# Altium footprint library LukaLIBRARY.PcbLib: 772 footprints (part 38 of 49)
Each footprint in its own frame and in the unit in brackets; x right, y up, seen from the top. Pads: shape width x height; smd on the part's side, far side on the other; paste and mask are expansions set on the pad; w line width, h text height; cw(c..) or ccw(c..) is an arc to the next point about the centre after c.
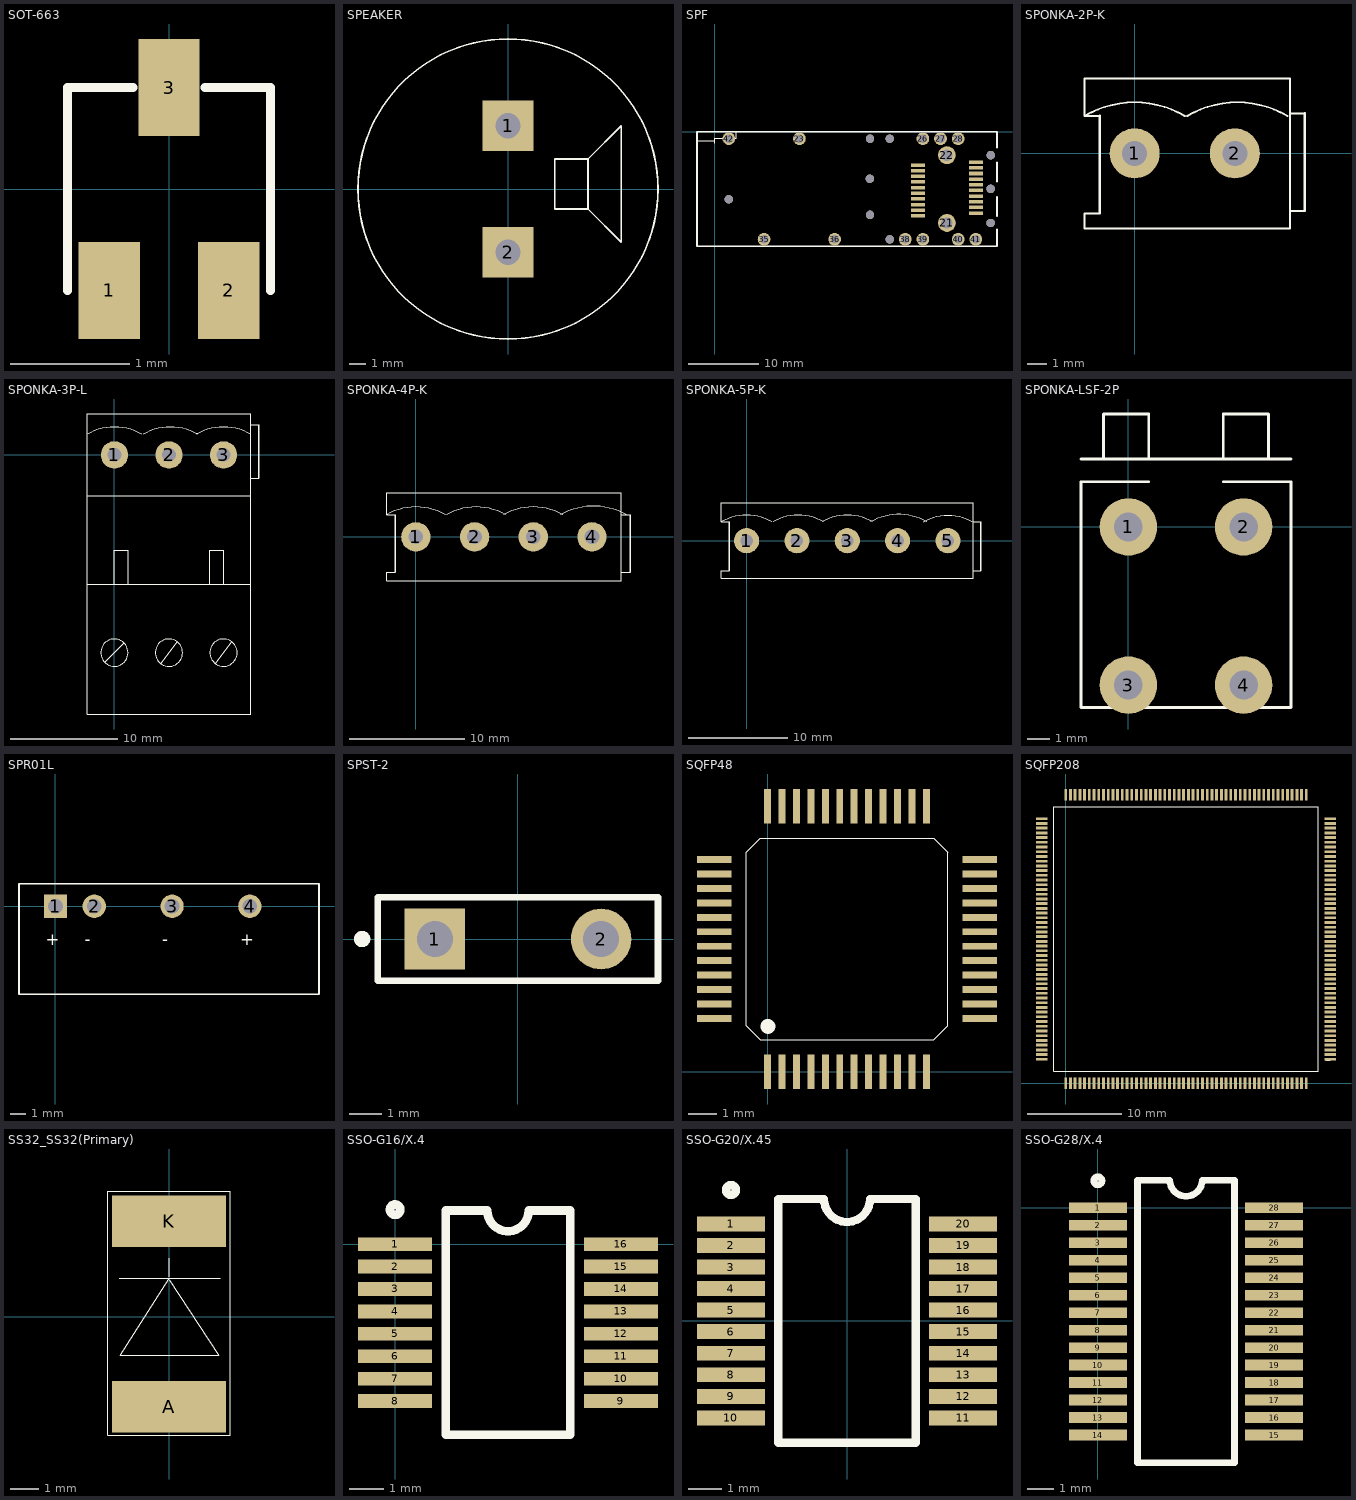
[diagram p37: the footprints below, top view; thin cyan lines are the x and y axes]

## SOT-663 [mm]
pads (3):
  rect 0.513x0.813 smd: 1(-0.5,-0.85) 2(0.5,-0.85) 3(0,0.85)
Top Overlay:
  lines w0.076: -0.85,-0.85 -0.85,0.85 -0.3,0.85 ; 0.3,0.85 0.85,0.85 0.85,-0.85

## SPEAKER [mil]
pads (2):
  rect 120x120 hole 60 mask-1000: 1(0,149.61) 2(0,-149.61)
Top Overlay:
  circle w3.94: c0,0 r354.33
  lines w3.94: 188.98,-47.24 110.24,-47.24 110.24,70.87 188.98,70.87 ; 188.98,-47.24 188.98,70.87 ; 188.98,-47.24 267.72,-125.98 267.72,149.61 188.98,70.87
Top Solder:
  region: -60,-209.61 60,-209.61 60,-89.61 -60,-89.61
  region: -60,89.61 60,89.61 60,209.61 -60,209.61
Bottom Solder:
  region: -60,-209.61 60,-209.61 60,-89.61 -60,-89.61
  region: -60,89.61 60,89.61 60,209.61 -60,209.61

## SPF [mm]
pads (42):
  rect 2x0.5 smd mask-25.4: 1(28.78,-4.72) 2(28.78,-5.52) 3(28.78,-6.32) 4(28.78,-7.12) 5(28.78,-7.92) 6(28.78,-8.72) 7(28.78,-9.52) 8(28.78,-10.32) 9(28.78,-11.12) 10(28.78,-11.92) 11(36.98,-11.52) 12(36.98,-10.72) 13(36.98,-9.92) 14(36.98,-9.12) 15(36.98,-8.32) 16(36.98,-7.52) 17(36.98,-6.72) 18(36.98,-5.92) 19(36.98,-5.12) 20(36.98,-4.32)
  round 2.524 hole 1.6: 21(32.88,-12.92) 22(32.88,-3.32)
  round 1.8 hole 1.2 mask-25.4: 23(11.99,-0.99) 26(29.48,-0.99) 27(31.98,-0.99) 28(34.48,-0.99) 35(6.98,-15.24) 36(16.98,-15.24) 38(26.98,-15.24) 39(29.48,-15.24) 40(34.48,-15.24) 41(36.98,-15.24) 42(1.99,-0.98)
  round 1.2 hole 1.2 mask-25.4: 24(21.99,-0.99) 25(24.78,-0.99) 29(39.09,-3.32) 30(39.08,-8.1) 31(39.08,-12.93) 32(21.98,-6.66) 33(1.99,-9.56) 34(21.99,-11.79) 37(24.78,-15.25)
Top Layer:
  lines w0.01: 39.08,-12.93 39.08,-12.9
Top Overlay:
  lines w0.01: -2.49,-1.29 0.01,-1.29 ; 0.01,-1.61 0.01,-0.89 3.01,-0.89 3.01,-0.01
  lines w0.254: 39.97,-11.98 39.97,-9.22 39.97,-9.2 ; 39.97,-2.24 39.97,0.01 -2.52,0.01 -2.52,-16.24 39.98,-16.24 39.98,-13.85 ; 39.98,-7.04 39.98,-4.35
Top Solder:
  drawing of 40 lines, arcs and shapes, not listed
Bottom Solder:
  drawing of 20 lines, arcs and shapes, not listed

## SPONKA-2P-K [mm]
pads (2):
  round 2.54 hole 1.27 mask-25.4: 1(0,0) 2(5.08,0)
Top Overlay:
  lines w0.1: -2.543,1.903 cw(c0,-2.413) 2.543,1.903 ; -1.778,-3.048 -2.54,-3.048 -2.54,-3.81 7.874,-3.81 7.874,3.81 -2.54,3.81 -2.54,1.905 -1.778,1.905 ; 2.664,1.903 cw(c5.207,-2.413) 7.75,1.903 ; 7.874,-2.921 8.636,-2.921 ; 7.874,2.032 8.636,2.032
  lines w0.127: -1.778,-3.048 -1.778,1.905 ; 8.636,-2.921 8.636,2.032
Top Solder:
  region: 5.08,1.281 4.748,1.237 4.44,1.109 4.174,0.906 3.971,0.64 3.843,0.332 3.799,0 3.843,-0.332 3.971,-0.64 4.174,-0.906 4.44,-1.109 4.748,-1.237 5.08,-1.281 5.412,-1.237 5.72,-1.109 5.986,-0.906 6.189,-0.64 6.317,-0.332 6.361,0 6.317,0.332 6.189,0.64 5.986,0.906 5.72,1.109 5.412,1.237
  region: 0,1.281 -0.332,1.237 -0.64,1.109 -0.906,0.906 -1.109,0.64 -1.237,0.332 -1.281,0 -1.237,-0.332 -1.109,-0.64 -0.906,-0.906 -0.64,-1.109 -0.332,-1.237 0,-1.281 0.332,-1.237 0.64,-1.109 0.906,-0.906 1.109,-0.64 1.237,-0.332 1.281,0 1.237,0.332 1.109,0.64 0.906,0.906 0.64,1.109 0.332,1.237
Bottom Solder:
  region: 5.08,1.281 4.748,1.237 4.44,1.109 4.174,0.906 3.971,0.64 3.843,0.332 3.799,0 3.843,-0.332 3.971,-0.64 4.174,-0.906 4.44,-1.109 4.748,-1.237 5.08,-1.281 5.412,-1.237 5.72,-1.109 5.986,-0.906 6.189,-0.64 6.317,-0.332 6.361,0 6.317,0.332 6.189,0.64 5.986,0.906 5.72,1.109 5.412,1.237
  region: 0,1.281 -0.332,1.237 -0.64,1.109 -0.906,0.906 -1.109,0.64 -1.237,0.332 -1.281,0 -1.237,-0.332 -1.109,-0.64 -0.906,-0.906 -0.64,-1.109 -0.332,-1.237 0,-1.281 0.332,-1.237 0.64,-1.109 0.906,-0.906 1.109,-0.64 1.237,-0.332 1.281,0 1.237,0.332 1.109,0.64 0.906,0.906 0.64,1.109 0.332,1.237

## SPONKA-3P-L [mm]
pads (3):
  round 2.54 hole 1.27 mask-25.4: 1(0,0) 2(5.08,0) 3(10.16,0)
Top Overlay:
  circle w0.1: c5.08,-18.415 r1.27
  circle w0.1: c10.16,-18.415 r1.27
  circle w0.1: c0,-18.415 r1.27
  lines w0.1: -2.543,1.903 cw(c0,-2.413) 2.543,1.903 ; -2.54,-12.065 12.7,-12.065 ; -2.54,-3.81 12.7,-3.81 ; -0.889,-19.304 0.889,-17.526 ; 0,-12.065 0,-8.89 1.27,-8.89 1.27,-12.065 ; 2.664,1.903 cw(c5.207,-2.413) 7.75,1.903 ; 4.318,-19.431 5.842,-17.399 ; 7.617,1.903 cw(c10.16,-2.413) 12.703,1.903 ; 8.89,-12.065 8.89,-8.89 10.16,-8.89 10.16,-12.065 ; 9.398,-19.431 10.922,-17.399 ; 12.7,-2.159 13.462,-2.159 ; 12.7,2.794 13.462,2.794 ; -2.54,-24.13 12.7,-24.13 12.7,3.81 -2.54,3.81 -2.54,-24.13
  lines w0.127: 13.462,-2.159 13.462,2.794
Top Solder:
  region: 5.08,1.281 4.748,1.237 4.44,1.109 4.174,0.906 3.971,0.64 3.843,0.332 3.799,0 3.843,-0.332 3.971,-0.64 4.174,-0.906 4.44,-1.109 4.748,-1.237 5.08,-1.281 5.412,-1.237 5.72,-1.109 5.986,-0.906 6.189,-0.64 6.317,-0.332 6.361,0 6.317,0.332 6.189,0.64 5.986,0.906 5.72,1.109 5.412,1.237
  region: 10.16,1.281 9.828,1.237 9.52,1.109 9.254,0.906 9.051,0.64 8.923,0.332 8.879,0 8.923,-0.332 9.051,-0.64 9.254,-0.906 9.52,-1.109 9.828,-1.237 10.16,-1.281 10.492,-1.237 10.8,-1.109 11.066,-0.906 11.269,-0.64 11.397,-0.332 11.441,0 11.397,0.332 11.269,0.64 11.066,0.906 10.8,1.109 10.492,1.237
  region: 0,1.281 -0.332,1.237 -0.64,1.109 -0.906,0.906 -1.109,0.64 -1.237,0.332 -1.281,0 -1.237,-0.332 -1.109,-0.64 -0.906,-0.906 -0.64,-1.109 -0.332,-1.237 0,-1.281 0.332,-1.237 0.64,-1.109 0.906,-0.906 1.109,-0.64 1.237,-0.332 1.281,0 1.237,0.332 1.109,0.64 0.906,0.906 0.64,1.109 0.332,1.237
Bottom Solder:
  region: 5.08,1.281 4.748,1.237 4.44,1.109 4.174,0.906 3.971,0.64 3.843,0.332 3.799,0 3.843,-0.332 3.971,-0.64 4.174,-0.906 4.44,-1.109 4.748,-1.237 5.08,-1.281 5.412,-1.237 5.72,-1.109 5.986,-0.906 6.189,-0.64 6.317,-0.332 6.361,0 6.317,0.332 6.189,0.64 5.986,0.906 5.72,1.109 5.412,1.237
  region: 10.16,1.281 9.828,1.237 9.52,1.109 9.254,0.906 9.051,0.64 8.923,0.332 8.879,0 8.923,-0.332 9.051,-0.64 9.254,-0.906 9.52,-1.109 9.828,-1.237 10.16,-1.281 10.492,-1.237 10.8,-1.109 11.066,-0.906 11.269,-0.64 11.397,-0.332 11.441,0 11.397,0.332 11.269,0.64 11.066,0.906 10.8,1.109 10.492,1.237
  region: 0,1.281 -0.332,1.237 -0.64,1.109 -0.906,0.906 -1.109,0.64 -1.237,0.332 -1.281,0 -1.237,-0.332 -1.109,-0.64 -0.906,-0.906 -0.64,-1.109 -0.332,-1.237 0,-1.281 0.332,-1.237 0.64,-1.109 0.906,-0.906 1.109,-0.64 1.237,-0.332 1.281,0 1.237,0.332 1.109,0.64 0.906,0.906 0.64,1.109 0.332,1.237

## SPONKA-4P-K [mm]
pads (4):
  round 2.54 hole 1.27 mask-25.4: 1(0,0) 2(5.08,0) 3(10.16,0) 4(15.24,0)
Top Overlay:
  lines w0.1: -2.543,1.903 cw(c0,-2.413) 2.543,1.903 ; -1.778,-3.048 -2.54,-3.048 -2.54,-3.81 17.78,-3.81 17.78,3.81 -2.54,3.81 -2.54,1.905 -1.778,1.905 ; 2.664,1.903 cw(c5.207,-2.413) 7.75,1.903 ; 7.617,1.903 cw(c10.16,-2.413) 12.703,1.903 ; 12.531,1.894 cw(c15.367,-2.921) 18.203,1.894 ; 17.78,-3.048 18.542,-3.048 ; 17.78,1.905 18.542,1.905
  lines w0.127: -1.778,-3.048 -1.778,1.905 ; 18.542,-3.048 18.542,1.905
Top Solder:
  region: 0,1.281 -0.332,1.237 -0.64,1.109 -0.906,0.906 -1.109,0.64 -1.237,0.332 -1.281,0 -1.237,-0.332 -1.109,-0.64 -0.906,-0.906 -0.64,-1.109 -0.332,-1.237 0,-1.281 0.332,-1.237 0.64,-1.109 0.906,-0.906 1.109,-0.64 1.237,-0.332 1.281,0 1.237,0.332 1.109,0.64 0.906,0.906 0.64,1.109 0.332,1.237
  region: 5.08,1.281 4.748,1.237 4.44,1.109 4.174,0.906 3.971,0.64 3.843,0.332 3.799,0 3.843,-0.332 3.971,-0.64 4.174,-0.906 4.44,-1.109 4.748,-1.237 5.08,-1.281 5.412,-1.237 5.72,-1.109 5.986,-0.906 6.189,-0.64 6.317,-0.332 6.361,0 6.317,0.332 6.189,0.64 5.986,0.906 5.72,1.109 5.412,1.237
  region: 15.24,1.281 14.908,1.237 14.6,1.109 14.334,0.906 14.131,0.64 14.003,0.332 13.959,0 14.003,-0.332 14.131,-0.64 14.334,-0.906 14.6,-1.109 14.908,-1.237 15.24,-1.281 15.572,-1.237 15.88,-1.109 16.146,-0.906 16.349,-0.64 16.477,-0.332 16.521,0 16.477,0.332 16.349,0.64 16.146,0.906 15.88,1.109 15.572,1.237
  region: 10.16,1.281 9.828,1.237 9.52,1.109 9.254,0.906 9.051,0.64 8.923,0.332 8.879,0 8.923,-0.332 9.051,-0.64 9.254,-0.906 9.52,-1.109 9.828,-1.237 10.16,-1.281 10.492,-1.237 10.8,-1.109 11.066,-0.906 11.269,-0.64 11.397,-0.332 11.441,0 11.397,0.332 11.269,0.64 11.066,0.906 10.8,1.109 10.492,1.237
Bottom Solder:
  region: 0,1.281 -0.332,1.237 -0.64,1.109 -0.906,0.906 -1.109,0.64 -1.237,0.332 -1.281,0 -1.237,-0.332 -1.109,-0.64 -0.906,-0.906 -0.64,-1.109 -0.332,-1.237 0,-1.281 0.332,-1.237 0.64,-1.109 0.906,-0.906 1.109,-0.64 1.237,-0.332 1.281,0 1.237,0.332 1.109,0.64 0.906,0.906 0.64,1.109 0.332,1.237
  region: 5.08,1.281 4.748,1.237 4.44,1.109 4.174,0.906 3.971,0.64 3.843,0.332 3.799,0 3.843,-0.332 3.971,-0.64 4.174,-0.906 4.44,-1.109 4.748,-1.237 5.08,-1.281 5.412,-1.237 5.72,-1.109 5.986,-0.906 6.189,-0.64 6.317,-0.332 6.361,0 6.317,0.332 6.189,0.64 5.986,0.906 5.72,1.109 5.412,1.237
  region: 15.24,1.281 14.908,1.237 14.6,1.109 14.334,0.906 14.131,0.64 14.003,0.332 13.959,0 14.003,-0.332 14.131,-0.64 14.334,-0.906 14.6,-1.109 14.908,-1.237 15.24,-1.281 15.572,-1.237 15.88,-1.109 16.146,-0.906 16.349,-0.64 16.477,-0.332 16.521,0 16.477,0.332 16.349,0.64 16.146,0.906 15.88,1.109 15.572,1.237
  region: 10.16,1.281 9.828,1.237 9.52,1.109 9.254,0.906 9.051,0.64 8.923,0.332 8.879,0 8.923,-0.332 9.051,-0.64 9.254,-0.906 9.52,-1.109 9.828,-1.237 10.16,-1.281 10.492,-1.237 10.8,-1.109 11.066,-0.906 11.269,-0.64 11.397,-0.332 11.441,0 11.397,0.332 11.269,0.64 11.066,0.906 10.8,1.109 10.492,1.237

## SPONKA-5P-K [mm]
pads (5):
  round 2.54 hole 1.27 mask-25.4: 1(0,0) 2(5.08,0) 3(10.16,0) 4(15.24,0) 5(20.32,0)
Top Overlay:
  lines w0.1: -2.543,1.903 cw(c0,-2.413) 2.543,1.903 ; -1.778,-3.048 -2.54,-3.048 -2.54,-3.81 22.86,-3.81 22.86,3.81 -2.54,3.81 -2.54,1.905 -1.778,1.905 ; 2.664,1.903 cw(c5.207,-2.413) 7.75,1.903 ; 7.617,1.903 cw(c10.16,-2.413) 12.703,1.903 ; 12.531,1.894 cw(c15.367,-2.921) 18.203,1.894 ; 17.806,1.855 cw(c20.32,-2.413) 22.834,1.855 ; 22.86,-3.048 23.622,-3.048 ; 22.86,1.905 23.622,1.905
  lines w0.127: -1.778,-3.048 -1.778,1.905 ; 23.622,-3.048 23.622,1.905
Top Solder:
  region: 0,1.281 -0.332,1.237 -0.64,1.109 -0.906,0.906 -1.109,0.64 -1.237,0.332 -1.281,0 -1.237,-0.332 -1.109,-0.64 -0.906,-0.906 -0.64,-1.109 -0.332,-1.237 0,-1.281 0.332,-1.237 0.64,-1.109 0.906,-0.906 1.109,-0.64 1.237,-0.332 1.281,0 1.237,0.332 1.109,0.64 0.906,0.906 0.64,1.109 0.332,1.237
  region: 10.16,1.281 9.828,1.237 9.52,1.109 9.254,0.906 9.051,0.64 8.923,0.332 8.879,0 8.923,-0.332 9.051,-0.64 9.254,-0.906 9.52,-1.109 9.828,-1.237 10.16,-1.281 10.492,-1.237 10.8,-1.109 11.066,-0.906 11.269,-0.64 11.397,-0.332 11.441,0 11.397,0.332 11.269,0.64 11.066,0.906 10.8,1.109 10.492,1.237
  region: 15.24,1.281 14.908,1.237 14.6,1.109 14.334,0.906 14.131,0.64 14.003,0.332 13.959,0 14.003,-0.332 14.131,-0.64 14.334,-0.906 14.6,-1.109 14.908,-1.237 15.24,-1.281 15.572,-1.237 15.88,-1.109 16.146,-0.906 16.349,-0.64 16.477,-0.332 16.521,0 16.477,0.332 16.349,0.64 16.146,0.906 15.88,1.109 15.572,1.237
  region: 5.08,1.281 4.748,1.237 4.44,1.109 4.174,0.906 3.971,0.64 3.843,0.332 3.799,0 3.843,-0.332 3.971,-0.64 4.174,-0.906 4.44,-1.109 4.748,-1.237 5.08,-1.281 5.412,-1.237 5.72,-1.109 5.986,-0.906 6.189,-0.64 6.317,-0.332 6.361,0 6.317,0.332 6.189,0.64 5.986,0.906 5.72,1.109 5.412,1.237
  region: 20.32,1.281 19.988,1.237 19.68,1.109 19.414,0.906 19.211,0.64 19.083,0.332 19.039,0 19.083,-0.332 19.211,-0.64 19.414,-0.906 19.68,-1.109 19.988,-1.237 20.32,-1.281 20.652,-1.237 20.96,-1.109 21.226,-0.906 21.429,-0.64 21.557,-0.332 21.601,0 21.557,0.332 21.429,0.64 21.226,0.906 20.96,1.109 20.652,1.237
Bottom Solder:
  region: 0,1.281 -0.332,1.237 -0.64,1.109 -0.906,0.906 -1.109,0.64 -1.237,0.332 -1.281,0 -1.237,-0.332 -1.109,-0.64 -0.906,-0.906 -0.64,-1.109 -0.332,-1.237 0,-1.281 0.332,-1.237 0.64,-1.109 0.906,-0.906 1.109,-0.64 1.237,-0.332 1.281,0 1.237,0.332 1.109,0.64 0.906,0.906 0.64,1.109 0.332,1.237
  region: 10.16,1.281 9.828,1.237 9.52,1.109 9.254,0.906 9.051,0.64 8.923,0.332 8.879,0 8.923,-0.332 9.051,-0.64 9.254,-0.906 9.52,-1.109 9.828,-1.237 10.16,-1.281 10.492,-1.237 10.8,-1.109 11.066,-0.906 11.269,-0.64 11.397,-0.332 11.441,0 11.397,0.332 11.269,0.64 11.066,0.906 10.8,1.109 10.492,1.237
  region: 15.24,1.281 14.908,1.237 14.6,1.109 14.334,0.906 14.131,0.64 14.003,0.332 13.959,0 14.003,-0.332 14.131,-0.64 14.334,-0.906 14.6,-1.109 14.908,-1.237 15.24,-1.281 15.572,-1.237 15.88,-1.109 16.146,-0.906 16.349,-0.64 16.477,-0.332 16.521,0 16.477,0.332 16.349,0.64 16.146,0.906 15.88,1.109 15.572,1.237
  region: 5.08,1.281 4.748,1.237 4.44,1.109 4.174,0.906 3.971,0.64 3.843,0.332 3.799,0 3.843,-0.332 3.971,-0.64 4.174,-0.906 4.44,-1.109 4.748,-1.237 5.08,-1.281 5.412,-1.237 5.72,-1.109 5.986,-0.906 6.189,-0.64 6.317,-0.332 6.361,0 6.317,0.332 6.189,0.64 5.986,0.906 5.72,1.109 5.412,1.237
  region: 20.32,1.281 19.988,1.237 19.68,1.109 19.414,0.906 19.211,0.64 19.083,0.332 19.039,0 19.083,-0.332 19.211,-0.64 19.414,-0.906 19.68,-1.109 19.988,-1.237 20.32,-1.281 20.652,-1.237 20.96,-1.109 21.226,-0.906 21.429,-0.64 21.557,-0.332 21.601,0 21.557,0.332 21.429,0.64 21.226,0.906 20.96,1.109 20.652,1.237

## SPONKA-LSF-2P [mm]
pads (4):
  round 2.54 hole 1.27 mask-25.4: 1(0,0) 2(5.1,0) 3(0,-7) 4(5.1,-7)
Top Overlay:
  lines w0.127: -2.1,3 7.2,3 ; -1.1,3 -1.1,5 0.9,5 0.9,3 ; 0.9,2 -2.1,2 -2.1,0 -2.1,-8 7.2,-8 7.2,2 4.2,2 ; 4.2,3 4.2,5 6.2,5 6.2,3
Top Solder:
  region: 5.1,-5.719 4.768,-5.763 4.46,-5.891 4.194,-6.094 3.991,-6.36 3.863,-6.668 3.819,-7 3.863,-7.332 3.991,-7.64 4.194,-7.906 4.46,-8.109 4.768,-8.237 5.1,-8.281 5.432,-8.237 5.74,-8.109 6.006,-7.906 6.209,-7.64 6.337,-7.332 6.381,-7 6.337,-6.668 6.209,-6.36 6.006,-6.094 5.74,-5.891 5.432,-5.763
  region: 5.1,1.281 4.768,1.237 4.46,1.109 4.194,0.906 3.991,0.64 3.863,0.332 3.819,0 3.863,-0.332 3.991,-0.64 4.194,-0.906 4.46,-1.109 4.768,-1.237 5.1,-1.281 5.432,-1.237 5.74,-1.109 6.006,-0.906 6.209,-0.64 6.337,-0.332 6.381,0 6.337,0.332 6.209,0.64 6.006,0.906 5.74,1.109 5.432,1.237
  region: 0,-5.719 -0.332,-5.763 -0.64,-5.891 -0.906,-6.094 -1.109,-6.36 -1.237,-6.668 -1.281,-7 -1.237,-7.332 -1.109,-7.64 -0.906,-7.906 -0.64,-8.109 -0.332,-8.237 0,-8.281 0.332,-8.237 0.64,-8.109 0.906,-7.906 1.109,-7.64 1.237,-7.332 1.281,-7 1.237,-6.668 1.109,-6.36 0.906,-6.094 0.64,-5.891 0.332,-5.763
  region: 0,1.281 -0.332,1.237 -0.64,1.109 -0.906,0.906 -1.109,0.64 -1.237,0.332 -1.281,0 -1.237,-0.332 -1.109,-0.64 -0.906,-0.906 -0.64,-1.109 -0.332,-1.237 0,-1.281 0.332,-1.237 0.64,-1.109 0.906,-0.906 1.109,-0.64 1.237,-0.332 1.281,0 1.237,0.332 1.109,0.64 0.906,0.906 0.64,1.109 0.332,1.237
Bottom Solder:
  region: 5.1,-5.719 4.768,-5.763 4.46,-5.891 4.194,-6.094 3.991,-6.36 3.863,-6.668 3.819,-7 3.863,-7.332 3.991,-7.64 4.194,-7.906 4.46,-8.109 4.768,-8.237 5.1,-8.281 5.432,-8.237 5.74,-8.109 6.006,-7.906 6.209,-7.64 6.337,-7.332 6.381,-7 6.337,-6.668 6.209,-6.36 6.006,-6.094 5.74,-5.891 5.432,-5.763
  region: 5.1,1.281 4.768,1.237 4.46,1.109 4.194,0.906 3.991,0.64 3.863,0.332 3.819,0 3.863,-0.332 3.991,-0.64 4.194,-0.906 4.46,-1.109 4.768,-1.237 5.1,-1.281 5.432,-1.237 5.74,-1.109 6.006,-0.906 6.209,-0.64 6.337,-0.332 6.381,0 6.337,0.332 6.209,0.64 6.006,0.906 5.74,1.109 5.432,1.237
  region: 0,-5.719 -0.332,-5.763 -0.64,-5.891 -0.906,-6.094 -1.109,-6.36 -1.237,-6.668 -1.281,-7 -1.237,-7.332 -1.109,-7.64 -0.906,-7.906 -0.64,-8.109 -0.332,-8.237 0,-8.281 0.332,-8.237 0.64,-8.109 0.906,-7.906 1.109,-7.64 1.237,-7.332 1.281,-7 1.237,-6.668 1.109,-6.36 0.906,-6.094 0.64,-5.891 0.332,-5.763
  region: 0,1.281 -0.332,1.237 -0.64,1.109 -0.906,0.906 -1.109,0.64 -1.237,0.332 -1.281,0 -1.237,-0.332 -1.109,-0.64 -0.906,-0.906 -0.64,-1.109 -0.332,-1.237 0,-1.281 0.332,-1.237 0.64,-1.109 0.906,-0.906 1.109,-0.64 1.237,-0.332 1.281,0 1.237,0.332 1.109,0.64 0.906,0.906 0.64,1.109 0.332,1.237

## SPR01L [mil]
pads (4):
  rect 60x60 hole 38 mask-1000: 1(0,0)
  round 60 hole 38 mask-1000: 2(100,0) 3(300,0) 4(500,0)
Top Overlay:
  lines w3.94: -93.7,-225.98 -93.7,57.48 677.95,57.48 677.95,-225.98 -93.7,-225.98
  text "-" at 75,-100 h31.25
  text "+" at 475,-100 h31.25
  text "+" at -25,-100 h31.25
  text "-" at 275,-100 h31.25
Top Solder:
  region: 100,30.26 92.17,29.23 84.87,26.2 78.6,21.4 73.8,15.13 70.77,7.83 69.74,0 70.77,-7.83 73.8,-15.13 78.6,-21.4 84.87,-26.2 92.17,-29.23 100,-30.26 107.83,-29.23 115.13,-26.2 121.4,-21.4 126.2,-15.13 129.23,-7.83 130.26,0 129.23,7.83 126.2,15.13 121.4,21.4 115.13,26.2 107.83,29.23
  region: 500,30.26 492.17,29.23 484.87,26.2 478.6,21.4 473.8,15.13 470.77,7.83 469.74,0 470.77,-7.83 473.8,-15.13 478.6,-21.4 484.87,-26.2 492.17,-29.23 500,-30.26 507.83,-29.23 515.13,-26.2 521.4,-21.4 526.21,-15.13 529.23,-7.83 530.26,0 529.23,7.83 526.21,15.13 521.4,21.4 515.13,26.2 507.83,29.23
  region: -30,-30 30,-30 30,30 -30,30
  region: 300,30.26 292.17,29.23 284.87,26.2 278.6,21.4 273.8,15.13 270.77,7.83 269.74,0 270.77,-7.83 273.8,-15.13 278.6,-21.4 284.87,-26.2 292.17,-29.23 300,-30.26 307.83,-29.23 315.13,-26.2 321.4,-21.4 326.2,-15.13 329.23,-7.83 330.26,0 329.23,7.83 326.2,15.13 321.4,21.4 315.13,26.2 307.83,29.23
Bottom Solder:
  region: 100,30.26 92.17,29.23 84.87,26.2 78.6,21.4 73.8,15.13 70.77,7.83 69.74,0 70.77,-7.83 73.8,-15.13 78.6,-21.4 84.87,-26.2 92.17,-29.23 100,-30.26 107.83,-29.23 115.13,-26.2 121.4,-21.4 126.2,-15.13 129.23,-7.83 130.26,0 129.23,7.83 126.2,15.13 121.4,21.4 115.13,26.2 107.83,29.23
  region: 500,30.26 492.17,29.23 484.87,26.2 478.6,21.4 473.8,15.13 470.77,7.83 469.74,0 470.77,-7.83 473.8,-15.13 478.6,-21.4 484.87,-26.2 492.17,-29.23 500,-30.26 507.83,-29.23 515.13,-26.2 521.4,-21.4 526.21,-15.13 529.23,-7.83 530.26,0 529.23,7.83 526.21,15.13 521.4,21.4 515.13,26.2 507.83,29.23
  region: -30,-30 30,-30 30,30 -30,30
  region: 300,30.26 292.17,29.23 284.87,26.2 278.6,21.4 273.8,15.13 270.77,7.83 269.74,0 270.77,-7.83 273.8,-15.13 278.6,-21.4 284.87,-26.2 292.17,-29.23 300,-30.26 307.83,-29.23 315.13,-26.2 321.4,-21.4 326.2,-15.13 329.23,-7.83 330.26,0 329.23,7.83 326.2,15.13 321.4,21.4 315.13,26.2 307.83,29.23

## SPST-2 [mm] "Switch; 2 Leads"
pads (2):
  rect 1.85x1.85 hole 1.1: 1(-2.54,0)
  round 1.85 hole 1.1: 2(2.54,0)
Top Overlay:
  circle w0.25: c-4.761,-0.001 r0.125
  lines w0.2: -4.28,-1.27 4.28,-1.27 4.28,1.27 -4.28,1.27 -4.28,-1.27

## SQFP48 [mm]
pads (48):
  rect 0.24x1.2 smd: 1(0,0) 2(0.5,0) 3(1,0) 4(1.5,0) 5(2,0) 6(2.5,0) 7(3,0) 8(3.5,0) 9(4,0) 10(4.5,0) 11(5,0) 12(5.5,0) 25(5.5,9.2) 26(5,9.2) 27(4.5,9.2) 28(4,9.2) 29(3.5,9.2) 30(3,9.2) 31(2.5,9.2) 32(2,9.2) 33(1.5,9.2) 34(1,9.2) 35(0.5,9.2) 36(0,9.2)
  rect 1.2x0.24 smd: 13(7.35,1.85) 14(7.35,2.35) 15(7.35,2.85) 16(7.35,3.35) 17(7.35,3.85) 18(7.35,4.35) 19(7.35,4.85) 20(7.35,5.35) 21(7.35,5.85) 22(7.35,6.35) 23(7.35,6.85) 24(7.35,7.35) 37(-1.85,7.35) 38(-1.85,6.85) 39(-1.85,6.35) 40(-1.85,5.85) 41(-1.85,5.35) 42(-1.85,4.85) 43(-1.85,4.35) 44(-1.85,3.85) 45(-1.85,3.35) 46(-1.85,2.85) 47(-1.85,2.35) 48(-1.85,1.85)
Top Overlay:
  circle w0.254: c0.01,1.57 r0.13
  lines w0.025: -0.75,1.6 -0.25,1.1 5.75,1.1 6.25,1.6 6.25,7.6 5.75,8.1 -0.25,8.1 -0.75,7.6 -0.75,1.6

## SQFP208 [mm]
pads (208):
  rect 0.3x1.2 smd: 1(0,0) 2(0.5,0) 3(1,0) 4(1.5,0) 5(2,0) 6(2.5,0) 7(3,0) 8(3.5,0) 9(4,0) 10(4.5,0) 11(5,0) 12(5.5,0) 13(6,0) 14(6.5,0) 15(7,0) 16(7.5,0) 17(8,0) 18(8.5,0) 19(9,0) 20(9.5,0) 21(10,0) 22(10.5,0) 23(11,0) 24(11.5,0) 25(12,0) 26(12.5,0) 27(13,0) 28(13.5,0) 29(14,0) 30(14.5,0) 31(15,0) 32(15.5,0) 33(16,0) 34(16.5,0) 35(17,0) 36(17.5,0) 37(18,0) 38(18.5,0) 39(19,0) 40(19.5,0) 41(20,0) 42(20.5,0) 43(21,0) 44(21.5,0) 45(22,0) 46(22.5,0) 47(23,0) 48(23.5,0) 49(24,0) 50(24.5,0) 51(25,0) 52(25.5,0) 105(25.5,30.6) 106(25,30.6) 107(24.5,30.6) 108(24,30.6) 109(23.5,30.6) 110(23,30.6) 111(22.5,30.6) 112(22,30.6) 113(21.5,30.6) 114(21,30.6) 115(20.5,30.6) 116(20,30.6) 117(19.5,30.6) 118(19,30.6) 119(18.5,30.6) 120(18,30.6) 121(17.5,30.6) 122(17,30.6) 123(16.5,30.6) 124(16,30.6) 125(15.5,30.6) 126(15,30.6) 127(14.5,30.6) 128(14,30.6) 129(13.5,30.6) 130(13,30.6) 131(12.5,30.6) 132(12,30.6) 133(11.5,30.6) 134(11,30.6) 135(10.5,30.6) 136(10,30.6) 137(9.5,30.6) 138(9,30.6) 139(8.5,30.6) 140(8,30.6) 141(7.5,30.6) 142(7,30.6) 143(6.5,30.6) 144(6,30.6) 145(5.5,30.6) 146(5,30.6) 147(4.5,30.6) 148(4,30.6) 149(3.5,30.6) 150(3,30.6) 151(2.5,30.6) 152(2,30.6) 153(1.5,30.6) 154(1,30.6) 155(0.5,30.6) 156(0,30.6)
  rect 1.2x0.3 smd: 53(28.05,2.55) 54(28.05,3.05) 55(28.05,3.55) 56(28.05,4.05) 57(28.05,4.55) 58(28.05,5.05) 59(28.05,5.55) 60(28.05,6.05) 61(28.05,6.55) 62(28.05,7.05) 63(28.05,7.55) 64(28.05,8.05) 65(28.05,8.55) 66(28.05,9.05) 67(28.05,9.55) 68(28.05,10.05) 69(28.05,10.55) 70(28.05,11.05) 71(28.05,11.55) 72(28.05,12.05) 73(28.05,12.55) 74(28.05,13.05) 75(28.05,13.55) 76(28.05,14.05) 77(28.05,14.55) 78(28.05,15.05) 79(28.05,15.55) 80(28.05,16.05) 81(28.05,16.55) 82(28.05,17.05) 83(28.05,17.55) 84(28.05,18.05) 85(28.05,18.55) 86(28.05,19.05) 87(28.05,19.55) 88(28.05,20.05) 89(28.05,20.55) 90(28.05,21.05) 91(28.05,21.55) 92(28.05,22.05) 93(28.05,22.55) 94(28.05,23.05) 95(28.05,23.55) 96(28.05,24.05) 97(28.05,24.55) 98(28.05,25.05) 99(28.05,25.55) 100(28.05,26.05) 101(28.05,26.55) 102(28.05,27.05) 103(28.05,27.55) 104(28.05,28.05) 157(-2.55,28.05) 158(-2.55,27.55) 159(-2.55,27.05) 160(-2.55,26.55) 161(-2.55,26.05) 162(-2.55,25.55) 163(-2.55,25.05) 164(-2.55,24.55) 165(-2.55,24.05) 166(-2.55,23.55) 167(-2.55,23.05) 168(-2.55,22.55) 169(-2.55,22.05) 170(-2.55,21.55) 171(-2.55,21.05) 172(-2.55,20.55) 173(-2.55,20.05) 174(-2.55,19.55) 175(-2.55,19.05) 176(-2.55,18.55) 177(-2.55,18.05) 178(-2.55,17.55) 179(-2.55,17.05) 180(-2.55,16.55) 181(-2.55,16.05) 182(-2.55,15.55) 183(-2.55,15.05) 184(-2.55,14.55) 185(-2.55,14.05) 186(-2.55,13.55) 187(-2.55,13.05) 188(-2.55,12.55) 189(-2.55,12.05) 190(-2.55,11.55) 191(-2.55,11.05) 192(-2.55,10.55) 193(-2.55,10.05) 194(-2.55,9.55) 195(-2.55,9.05) 196(-2.55,8.55) 197(-2.55,8.05) 198(-2.55,7.55) 199(-2.55,7.05) 200(-2.55,6.55) 201(-2.55,6.05) 202(-2.55,5.55) 203(-2.55,5.05) 204(-2.55,4.55) 205(-2.55,4.05) 206(-2.55,3.55) 207(-2.55,3.05) 208(-2.55,2.55)
Top Overlay:
  lines w0.025: 27.55,2.45 28.05,2.45 28.05,2.65 27.55,2.65 ; -1.25,1.3 -1.25,29.3 26.75,29.3 26.75,1.3 -1.25,1.3

## SS32_SS32(Primary) [mm]
pads (2):
  rect 4x1.8 smd mask-25.4: A(0,-3.15) K(0,3.35)
Top Overlay:
  lines w0.01: -2.15,4.25 -2.15,4.4 2.15,4.4 2.15,-4.15 -2.15,-4.15 -2.15,4.35 ; -1.75,1.35 1.8,1.35 ; 0,1.3 1.75,-1.35 -1.7,-1.35 0,1.35 ; 0,1.4 0,2.05
Top Solder:
  region: -2,2.45 2,2.45 2,4.25 -2,4.25
  region: -2,-4.05 2,-4.05 2,-2.25 -2,-2.25

## SSO-G16/X.4 [mm]
pads (16):
  rect 2.15x0.4 smd: 1(0,0) 2(0,-0.65) 3(0,-1.3) 4(0,-1.95) 5(0,-2.6) 6(0,-3.25) 7(0,-3.9) 8(0,-4.55) 9(6.55,-4.55) 10(6.55,-3.9) 11(6.55,-3.25) 12(6.55,-2.6) 13(6.55,-1.95) 14(6.55,-1.3) 15(6.55,-0.65) 16(6.55,0)
Top Overlay:
  circle w0.25: c0,1 r0.15
  lines w0.25: 1.475,-5.525 1.475,0.975 2.675,0.975 ccw(c3.275,0.975) 3.875,0.975 5.075,0.975 5.075,-5.525 1.475,-5.525

## SSO-G20/X.45 [mm]
pads (20):
  rect 2.05x0.45 smd: 1(-3.5,2.925) 2(-3.5,2.275) 3(-3.5,1.625) 4(-3.5,0.975) 5(-3.5,0.325) 6(-3.5,-0.325) 7(-3.5,-0.975) 8(-3.5,-1.625) 9(-3.5,-2.275) 10(-3.5,-2.925) 11(3.5,-2.925) 12(3.5,-2.275) 13(3.5,-1.625) 14(3.5,-0.975) 15(3.5,-0.325) 16(3.5,0.325) 17(3.5,0.975) 18(3.5,1.625) 19(3.5,2.275) 20(3.5,2.925)
Top Overlay:
  circle w0.25: c-3.5,3.95 r0.15
  lines w0.25: -2.075,-3.675 -2.075,3.675 -0.692,3.675 ccw(c0,3.675) 0.692,3.675 2.075,3.675 2.075,-3.675 -2.075,-3.675

## SSO-G28/X.4 [mm]
pads (28):
  rect 2.15x0.4 smd: 1(0,0) 2(0,-0.65) 3(0,-1.3) 4(0,-1.95) 5(0,-2.6) 6(0,-3.25) 7(0,-3.9) 8(0,-4.55) 9(0,-5.2) 10(0,-5.85) 11(0,-6.5) 12(0,-7.15) 13(0,-7.8) 14(0,-8.45) 15(6.55,-8.45) 16(6.55,-7.8) 17(6.55,-7.15) 18(6.55,-6.5) 19(6.55,-5.85) 20(6.55,-5.2) 21(6.55,-4.55) 22(6.55,-3.9) 23(6.55,-3.25) 24(6.55,-2.6) 25(6.55,-1.95) 26(6.55,-1.3) 27(6.55,-0.65) 28(6.55,0)
Top Overlay:
  circle w0.25: c0,1 r0.15
  lines w0.25: 1.475,-9.475 1.475,1.025 2.675,1.025 ccw(c3.275,1.025) 3.875,1.025 5.075,1.025 5.075,-9.475 1.475,-9.475